# Altium footprint library SG__PCB_HOLE_Connector.PcbLib: 174 footprints (part 8 of 11)
Each footprint in its own frame and in the unit in brackets; x right, y up, seen from the top. Pads: shape width x height; smd on the part's side, far side on the other; paste and mask are expansions set on the pad; w line width, h text height; cw(c..) or ccw(c..) is an arc to the next point about the centre after c.
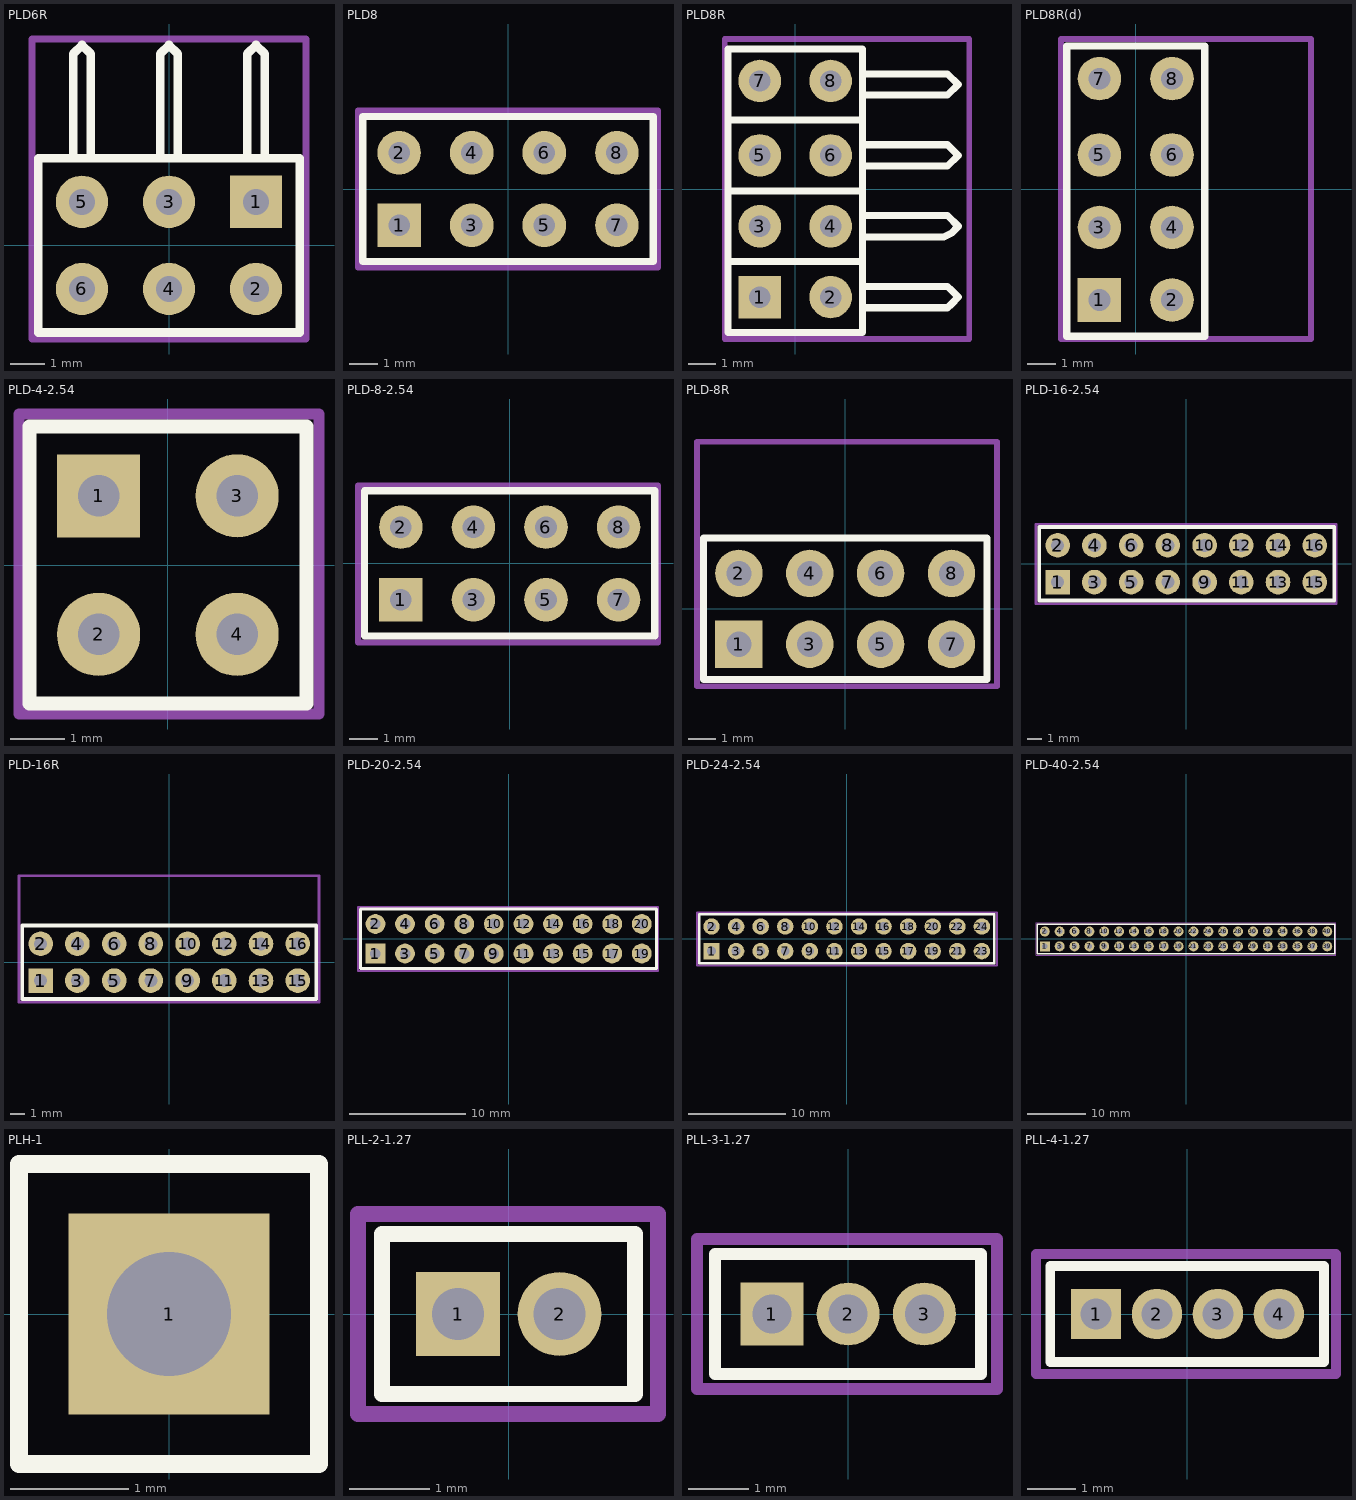
[diagram p7: the footprints below, top view; thin cyan lines are the x and y axes]

## PLD6R [mil]
pads (6):
  rect 60x60 hole 30: 1(100,50)
  round 60 hole 30: 2(100,-50) 3(0,50) 4(0,-50) 5(-100,50) 6(-100,-50)
Top Overlay:
  lines w10: -110,100 -110,220 -100,230 -90,220 -90,100 ; -10,100 -10,220 0,230 10,220 10,100 ; 90,100 90,220 100,230 110,220 110,100 ; -150,-100 150,-100 150,100 -150,100 -150,-100
Top Courtyard:
  lines w7.87: -157.48,-107.48 -157.48,237.01 157.48,237.01 157.48,-107.48 -157.48,-107.48
3D body "pld.stp": height -39.37, standoff -337.8, extent -150,-100 -50,231.5
3D body "pld.stp": height -39.37, standoff -337.8, extent -50,-100 50,231.5
3D body "pld.stp": height -39.37, standoff -337.8, extent 50,-100 150,231.5

## PLD8 [mil]
pads (8):
  rect 60x60 hole 30: 1(-150,-50)
  round 60 hole 30: 2(-150,50) 3(-50,-50) 4(-50,50) 5(50,-50) 6(50,50) 7(150,-50) 8(150,50)
Top Overlay:
  lines w10: -200,-100 200,-100 200,100 -200,100 -200,-100
Top Courtyard:
  lines w7.87: -206.69,-108.27 -206.69,108.27 206.69,108.27 206.69,-108.27 -206.69,-108.27
3D body "header2.stp": height 332.68, standoff 0, extent 101.78,-96.45 198.23,96.46
3D body "header2.stp": height 332.68, standoff 0, extent 1.78,-96.45 98.23,96.46
3D body "header2.stp": height 332.68, standoff 0, extent -98.22,-96.45 -1.77,96.46
3D body "header2.stp": height 332.68, standoff 0, extent -198.23,-96.45 -101.78,96.46

## PLD8R [mil] "PLD8 3d up"
pads (8):
  rect 60x60 hole 30: 1(-50,-152.5)
  round 60 hole 30: 2(50,-152.5) 3(-50,-52.5) 4(50,-52.5) 5(-50,47.5) 6(50,47.5) 7(-50,152.5) 8(50,152.5)
Top Overlay:
  lines w10: -95,-102.5 95,-102.5 ; -95,-2.5 95,-2.5 ; -95,97.5 95,97.5 ; 95,-167.5 215,-167.5 220,-162.5 230,-152.5 220,-142.5 215,-137.5 95,-137.5 ; 95,-67.5 210,-67.5 220,-62.5 230,-52.5 215,-37.5 210,-37.5 95,-37.5 ; 95,32.5 210,32.5 215,32.5 230,47.5 215,62.5 210,62.5 95,62.5 ; 95,132.5 210,132.5 215,132.5 230,147.5 215,162.5 210,162.5 95,162.5 ; -95,-202.5 -95,197.5 95,197.5 95,-202.5 -95,-202.5
Top Courtyard:
  lines w7.87: -99.21,-211.56 -99.21,211.67 245.28,211.67 245.28,-211.56 -99.21,-211.56
3D body "pld.stp": height 298.43, standoff 0, extent -96.5,97.5 235,197.5
3D body "pld.stp": height 298.43, standoff 0, extent -95.75,-2.5 235.75,97.5
3D body "pld.stp": height 298.43, standoff 0, extent -95.75,-102.5 235.75,-2.5
3D body "pld.stp": height 298.43, standoff 0, extent -95.75,-202.5 235.75,-102.5

## PLD8R(d) [mil] "PLD8 3d down"
pads (8):
  rect 60x60 hole 30: 1(-50,-152.5)
  round 60 hole 30: 2(50,-152.5) 3(-50,-52.5) 4(50,-52.5) 5(-50,47.5) 6(50,47.5) 7(-50,152.5) 8(50,152.5)
Top Overlay:
  lines w10: -95,-202.5 95,-202.5 95,197.5 -95,197.5 -95,-202.5
Bottom Overlay:
  lines w10: -95,-102.5 95,-102.5 ; -95,-2.5 95,-2.5 ; -95,97.5 95,97.5 ; 95,-167.5 215,-167.5 220,-162.5 230,-152.5 220,-142.5 215,-137.5 95,-137.5 ; 95,-67.5 210,-67.5 220,-62.5 230,-52.5 215,-37.5 210,-37.5 95,-37.5 ; 95,32.5 210,32.5 215,32.5 230,47.5 215,62.5 210,62.5 95,62.5 ; 95,132.5 210,132.5 215,132.5 230,147.5 215,162.5 210,162.5 95,162.5 ; -95,-202.5 95,-202.5 95,197.5 -95,197.5 -95,-202.5
Top Courtyard:
  lines w7.87: -102.95,-206.24 241.54,-206.24 241.54,207.15 -102.95,207.15 -102.95,-206.24
3D body "pld.stp": height -2, standoff -300.43, extent -95.75,-2.5 235.75,97.5
3D body "pld.stp": height -2, standoff -300.43, extent -96.5,97.5 235,197.5
3D body "pld.stp": height -2, standoff -300.43, extent -95.75,-102.5 235.75,-2.5
3D body "pld.stp": height -2, standoff -300.43, extent -95.75,-202.5 235.75,-102.5

## PLD-4-2.54 [mil]
pads (4):
  rect 60x60 hole 30: 1(-50,50)
  round 60 hole 30: 2(-50,-50) 3(50,50) 4(50,-50)
Top Overlay:
  lines w10: -100,-100 -100,100 100,100 100,-100 -100,-100
Top Courtyard:
  lines w7.87: -107.48,-107.48 -107.48,109.06 109.06,109.06 109.06,-107.48 -107.48,-107.48
3D body "header2.stp": height 332.68, standoff 0, extent -96.45,-98.22 96.46,-1.77
3D body "header2.stp": height 332.68, standoff 0, extent -96.46,1.77 96.46,98.23

## PLD-8-2.54 [mil]
pads (8):
  rect 60x60 hole 30: 1(-150,-50)
  round 60 hole 30: 2(-150,50) 3(-50,-50) 4(-50,50) 5(50,-50) 6(50,50) 7(150,-50) 8(150,50)
Top Overlay:
  lines w10: -200,-100 200,-100 200,100 -200,100 -200,-100
Top Courtyard:
  lines w7.87: -209.06,-109.06 204.33,-109.06 204.33,107.48 -209.06,107.48 -209.06,-109.06
3D body "header2.stp": height 332.68, standoff 0, extent 101.78,-96.45 198.23,96.46
3D body "header2.stp": height 332.68, standoff 0, extent 1.78,-96.45 98.23,96.46
3D body "header2.stp": height 332.68, standoff 0, extent -98.22,-96.45 -1.77,96.46
3D body "header2.stp": height 332.68, standoff 0, extent -198.23,-96.45 -101.78,96.46

## PLD-8R [mm]
pads (8):
  rect 1.7x1.7 hole 0.9: 1(-3.81,-1.27)
  round 1.7 hole 0.9: 2(-3.81,1.27) 3(-1.27,-1.27) 4(-1.27,1.27) 5(1.27,-1.27) 6(1.27,1.27) 7(3.81,-1.27) 8(3.81,1.27)
Top Overlay:
  lines w0.254: -5.08,-2.54 5.08,-2.54 5.08,2.54 -5.08,2.54 -5.08,-2.54
Top Courtyard:
  lines w0.2: -5.31,-2.77 5.44,-2.77 5.44,5.98 -5.31,5.98 -5.31,-2.77
3D body "pld.stp": height 7.58, standoff 0, extent 2.54,-2.578 5.08,5.842
3D body "pld.stp": height 7.58, standoff 0, extent 0,-2.578 2.54,5.842
3D body "pld.stp": height 7.58, standoff 0, extent -2.54,-2.578 0,5.842
3D body "pld.stp": height 7.58, standoff 0, extent -5.08,-2.578 -2.54,5.842

## PLD-16-2.54 [mm]
pads (16):
  rect 1.7x1.7 hole 0.9: 1(-8.89,-1.27)
  round 1.7 hole 0.9: 2(-8.89,1.27) 3(-6.35,-1.27) 4(-6.35,1.27) 5(-3.81,-1.27) 6(-3.81,1.27) 7(-1.27,-1.27) 8(-1.27,1.27) 9(1.27,-1.27) 10(1.27,1.27) 11(3.81,-1.27) 12(3.81,1.27) 13(6.35,-1.27) 14(6.35,1.27) 15(8.89,-1.27) 16(8.89,1.27)
Top Overlay:
  lines w0.254: -10.16,-2.54 -10.16,2.54 10.236,2.54 10.236,-2.54 -10.16,-2.54
Top Courtyard:
  lines w0.2: -10.39,-2.77 10.36,-2.77 10.36,2.73 -10.39,2.73 -10.39,-2.77
3D body "header2.stp": height 8.45, standoff 0, extent 7.665,-2.45 10.115,2.45
3D body "header2.stp": height 8.45, standoff 0, extent 5.125,-2.45 7.575,2.45
3D body "header2.stp": height 8.45, standoff 0, extent 2.585,-2.45 5.035,2.45
3D body "header2.stp": height 8.45, standoff 0, extent 0.045,-2.45 2.495,2.45
3D body "header2.stp": height 8.45, standoff 0, extent -10.115,-2.45 -7.665,2.45
3D body "header2.stp": height 8.45, standoff 0, extent -7.575,-2.45 -5.125,2.45
3D body "header2.stp": height 8.45, standoff 0, extent -5.035,-2.45 -2.585,2.45
3D body "header2.stp": height 8.45, standoff 0, extent -2.495,-2.45 -0.045,2.45

## PLD-16R [mm]
pads (16):
  rect 1.7x1.7 hole 0.9: 1(-8.89,-1.27)
  round 1.7 hole 0.9: 2(-8.89,1.27) 3(-6.35,-1.27) 4(-6.35,1.27) 5(-3.81,-1.27) 6(-3.81,1.27) 7(-1.27,-1.27) 8(-1.27,1.27) 9(1.27,-1.27) 10(1.27,1.27) 11(3.81,-1.27) 12(3.81,1.27) 13(6.35,-1.27) 14(6.35,1.27) 15(8.89,-1.27) 16(8.89,1.27)
Top Overlay:
  lines w0.254: -10.16,-2.54 10.16,-2.54 10.16,2.54 -10.16,2.54 -10.16,-2.54
Top Courtyard:
  lines w0.2: -10.39,-2.77 -10.39,5.98 10.36,5.98 10.36,-2.77 -10.39,-2.77
3D body "pld.stp": height 7.58, standoff 0, extent 7.62,-2.578 10.16,5.842
3D body "pld.stp": height 7.58, standoff 0, extent 5.08,-2.578 7.62,5.842
3D body "pld.stp": height 7.58, standoff 0, extent 2.54,-2.578 5.08,5.842
3D body "pld.stp": height 7.58, standoff 0, extent 0,-2.578 2.54,5.842
3D body "pld.stp": height 7.58, standoff 0, extent -2.54,-2.578 0,5.842
3D body "pld.stp": height 7.58, standoff 0, extent -5.08,-2.578 -2.54,5.842
3D body "pld.stp": height 7.58, standoff 0, extent -7.62,-2.578 -5.08,5.842
3D body "pld.stp": height 7.58, standoff 0, extent -10.16,-2.578 -7.62,5.842

## PLD-20-2.54 [mm]
pads (20):
  rect 1.7x1.7 hole 0.9: 1(-11.43,-1.27)
  round 1.7 hole 0.9: 2(-11.43,1.27) 3(-8.89,-1.27) 4(-8.89,1.27) 5(-6.35,-1.27) 6(-6.35,1.27) 7(-3.81,-1.27) 8(-3.81,1.27) 9(-1.27,-1.27) 10(-1.27,1.27) 11(1.27,-1.27) 12(1.27,1.27) 13(3.81,-1.27) 14(3.81,1.27) 15(6.35,-1.27) 16(6.35,1.27) 17(8.89,-1.27) 18(8.89,1.27) 19(11.43,-1.27) 20(11.43,1.27)
Top Overlay:
  lines w0.254: -12.7,-2.54 -12.7,2.54 12.7,2.54 12.7,-2.54 -12.7,-2.54
Top Courtyard:
  lines w0.2: -12.93,-2.77 -12.93,2.73 12.82,2.73 12.82,-2.77 -12.93,-2.77
3D body "header2.stp": height 8.45, standoff 0, extent -5.035,-2.45 -2.585,2.45
3D body "header2.stp": height 8.45, standoff 0, extent -7.575,-2.45 -5.125,2.45
3D body "header2.stp": height 8.45, standoff 0, extent -10.115,-2.45 -7.665,2.45
3D body "header2.stp": height 8.45, standoff 0, extent -12.655,-2.45 -10.205,2.45
3D body "header2.stp": height 8.45, standoff 0, extent -2.495,-2.45 -0.045,2.45
3D body "header2.stp": height 8.45, standoff 0, extent 0.045,-2.45 2.495,2.45
3D body "header2.stp": height 8.45, standoff 0, extent 2.585,-2.45 5.035,2.45
3D body "header2.stp": height 8.45, standoff 0, extent 5.125,-2.45 7.575,2.45
3D body "header2.stp": height 8.45, standoff 0, extent 7.665,-2.45 10.115,2.45
3D body "header2.stp": height 8.45, standoff 0, extent 10.205,-2.45 12.655,2.45

## PLD-24-2.54 [mm]
pads (24):
  rect 1.7x1.7 hole 0.9: 1(-13.97,-1.27)
  round 1.7 hole 0.9: 2(-13.97,1.27) 3(-11.43,-1.27) 4(-11.43,1.27) 5(-8.89,-1.27) 6(-8.89,1.27) 7(-6.35,-1.27) 8(-6.35,1.27) 9(-3.81,-1.27) 10(-3.81,1.27) 11(-1.27,-1.27) 12(-1.27,1.27) 13(1.27,-1.27) 14(1.27,1.27) 15(3.81,-1.27) 16(3.81,1.27) 17(6.35,-1.27) 18(6.35,1.27) 19(8.89,-1.27) 20(8.89,1.27) 21(11.43,-1.27) 22(11.43,1.27) 23(13.97,-1.27) 24(13.97,1.27)
Top Overlay:
  lines w0.254: -15.24,-2.54 15.24,-2.54 15.24,2.54 -15.24,2.54 -15.24,-2.54
Top Courtyard:
  lines w0.2: -15.47,-2.77 15.53,-2.77 15.53,2.73 -15.47,2.73 -15.47,-2.77
3D body "header2.stp": height 8.45, standoff 0, extent 12.745,-2.45 15.195,2.45
3D body "header2.stp": height 8.45, standoff 0, extent 10.205,-2.45 12.655,2.45
3D body "header2.stp": height 8.45, standoff 0, extent 7.665,-2.45 10.115,2.45
3D body "header2.stp": height 8.45, standoff 0, extent 5.125,-2.45 7.575,2.45
3D body "header2.stp": height 8.45, standoff 0, extent -7.575,-2.45 -5.125,2.45
3D body "header2.stp": height 8.45, standoff 0, extent -10.115,-2.45 -7.665,2.45
3D body "header2.stp": height 8.45, standoff 0, extent -12.655,-2.45 -10.205,2.45
3D body "header2.stp": height 8.45, standoff 0, extent -15.195,-2.45 -12.745,2.45
3D body "header2.stp": height 8.45, standoff 0, extent -5.035,-2.45 -2.585,2.45
3D body "header2.stp": height 8.45, standoff 0, extent -2.495,-2.45 -0.045,2.45
3D body "header2.stp": height 8.45, standoff 0, extent 0.045,-2.45 2.495,2.45
3D body "header2.stp": height 8.45, standoff 0, extent 2.585,-2.45 5.035,2.45

## PLD-40-2.54 [mm]
pads (40):
  rect 1.7x1.7 hole 0.9: 1(-24.13,-1.27)
  round 1.7 hole 0.9: 2(-24.13,1.27) 3(-21.59,-1.27) 4(-21.59,1.27) 5(-19.05,-1.27) 6(-19.05,1.27) 7(-16.51,-1.27) 8(-16.51,1.27) 9(-13.97,-1.27) 10(-13.97,1.27) 11(-11.43,-1.27) 12(-11.43,1.27) 13(-8.89,-1.27) 14(-8.89,1.27) 15(-6.35,-1.27) 16(-6.35,1.27) 17(-3.81,-1.27) 18(-3.81,1.27) 19(-1.27,-1.27) 20(-1.27,1.27) 21(1.27,-1.27) 22(1.27,1.27) 23(3.81,-1.27) 24(3.81,1.27) 25(6.35,-1.27) 26(6.35,1.27) 27(8.89,-1.27) 28(8.89,1.27) 29(11.43,-1.27) 30(11.43,1.27) 31(13.97,-1.27) 32(13.97,1.27) 33(16.51,-1.27) 34(16.51,1.27) 35(19.05,-1.27) 36(19.05,1.27) 37(21.59,-1.27) 38(21.59,1.27) 39(24.13,-1.27) 40(24.13,1.27)
Top Overlay:
  lines w0.254: -25.4,-2.54 0,-2.54 25.4,-2.54 25.4,2.54 0,2.54 -25.4,2.54 -25.4,-2.54
Top Courtyard:
  lines w0.2: -25.63,-2.77 -25.63,2.73 25.62,2.73 25.62,-2.77 -25.63,-2.77
3D body "PLS1.stp": height 8.54, standoff -3, extent 22.86,-2.54 25.4,0
3D body "PLS1.stp": height 8.54, standoff -3, extent 22.86,0 25.4,2.54
3D body "PLS1.stp": height 8.54, standoff -3, extent 20.32,-2.54 22.86,0
3D body "PLS1.stp": height 8.54, standoff -3, extent 20.32,0 22.86,2.54
3D body "PLS1.stp": height 8.54, standoff -3, extent 17.78,-2.54 20.32,0
3D body "PLS1.stp": height 8.54, standoff -3, extent 17.78,0 20.32,2.54
3D body "PLS1.stp": height 8.54, standoff -3, extent 15.24,-2.54 17.78,0
3D body "PLS1.stp": height 8.54, standoff -3, extent 15.24,0 17.78,2.54
3D body "PLS1.stp": height 8.54, standoff -3, extent 12.7,-2.54 15.24,0
3D body "PLS1.stp": height 8.54, standoff -3, extent 12.7,0 15.24,2.54
3D body "PLS1.stp": height 8.54, standoff -3, extent 10.16,-2.54 12.7,0
3D body "PLS1.stp": height 8.54, standoff -3, extent 10.16,0 12.7,2.54
3D body "PLS1.stp": height 8.54, standoff -3, extent 7.62,-2.54 10.16,0
3D body "PLS1.stp": height 8.54, standoff -3, extent 7.62,0 10.16,2.54
3D body "PLS1.stp": height 8.54, standoff -3, extent 5.08,-2.54 7.62,0
3D body "PLS1.stp": height 8.54, standoff -3, extent 5.08,0 7.62,2.54
3D body "PLS1.stp": height 8.54, standoff -3, extent 2.54,-2.54 5.08,0
3D body "PLS1.stp": height 8.54, standoff -3, extent 2.54,0 5.08,2.54
3D body "PLS1.stp": height 8.54, standoff -3, extent 0,-2.54 2.54,0
3D body "PLS1.stp": height 8.54, standoff -3, extent 0,0 2.54,2.54
3D body "PLS1.stp": height 8.54, standoff -3, extent -2.54,-2.54 0,0
3D body "PLS1.stp": height 8.54, standoff -3, extent -2.54,0 0,2.54
3D body "PLS1.stp": height 8.54, standoff -3, extent -5.08,-2.54 -2.54,0
3D body "PLS1.stp": height 8.54, standoff -3, extent -5.08,0 -2.54,2.54
3D body "PLS1.stp": height 8.54, standoff -3, extent -7.62,-2.54 -5.08,0
3D body "PLS1.stp": height 8.54, standoff -3, extent -7.62,0 -5.08,2.54
3D body "PLS1.stp": height 8.54, standoff -3, extent -10.16,-2.54 -7.62,0
3D body "PLS1.stp": height 8.54, standoff -3, extent -10.16,0 -7.62,2.54
3D body "PLS1.stp": height 8.54, standoff -3, extent -12.7,-2.54 -10.16,0
3D body "PLS1.stp": height 8.54, standoff -3, extent -12.7,0 -10.16,2.54
3D body "PLS1.stp": height 8.54, standoff -3, extent -15.24,-2.54 -12.7,0
3D body "PLS1.stp": height 8.54, standoff -3, extent -15.24,0 -12.7,2.54
3D body "PLS1.stp": height 8.54, standoff -3, extent -17.78,-2.54 -15.24,0
3D body "PLS1.stp": height 8.54, standoff -3, extent -17.78,0 -15.24,2.54
3D body "PLS1.stp": height 8.54, standoff -3, extent -20.32,-2.54 -17.78,0
3D body "PLS1.stp": height 8.54, standoff -3, extent -20.32,0 -17.78,2.54
3D body "PLS1.stp": height 8.54, standoff -3, extent -22.86,-2.54 -20.32,0
3D body "PLS1.stp": height 8.54, standoff -3, extent -22.86,0 -20.32,2.54
3D body "PLS1.stp": height 8.54, standoff -3, extent -25.4,-2.54 -22.86,0
3D body "PLS1.stp": height 8.54, standoff -3, extent -25.4,0 -22.86,2.54

## PLH-1 [mm]
pads (1):
  rect 1.7x1.7 hole 1.05 mask+0.05: 1(0,0)
Top Overlay:
  lines w0.15: -1.27,-1.27 1.27,-1.27 1.27,1.27 -1.27,1.27 -1.27,-1.27

## PLL-2-1.27 [mm]
pads (2):
  rect 1.05x1.05 hole 0.65 mask+0.05: 1(-0.635,0)
  round 1.05 hole 0.65 mask+0.05: 2(0.635,0)
Top Overlay:
  lines w0.2: -1.585,-1 1.575,-1 1.575,1 -1.585,1 -1.585,-1
Top Courtyard:
  lines w0.2: -1.885,-1.25 1.865,-1.25 1.865,1.25 -1.885,1.25 -1.885,-1.25

## PLL-3-1.27 [mm]
pads (3):
  rect 1.05x1.05 hole 0.65 mask+0.05: 1(-1.27,0)
  round 1.05 hole 0.65 mask+0.05: 2(0,0) 3(1.27,0)
Top Overlay:
  lines w0.2: -2.22,-1 2.21,-1 2.21,1 -2.22,1 -2.22,-1
Top Courtyard:
  lines w0.2: -2.52,-1.25 -2.52,1.25 2.48,1.25 2.48,-1.25 -2.52,-1.25

## PLL-4-1.27 [mm]
pads (4):
  rect 1.05x1.05 hole 0.65 mask+0.05: 1(-1.905,0)
  round 1.05 hole 0.65 mask+0.05: 2(-0.635,0) 3(0.635,0) 4(1.905,0)
Top Overlay:
  lines w0.2: -2.855,-1 2.845,-1 2.845,1 -2.855,1 -2.855,-1
Top Courtyard:
  lines w0.2: -3.155,-1.25 -3.155,1.25 3.095,1.25 3.095,-1.25 -3.155,-1.25